# Altium footprint library PcbLibUltimate (1).pcblib: 202 footprints (part 3 of 13)
Each footprint in its own frame and in the unit in brackets; x right, y up, seen from the top. Pads: shape width x height; smd on the part's side, far side on the other; paste and mask are expansions set on the pad; w line width, h text height; cw(c..) or ccw(c..) is an arc to the next point about the centre after c.
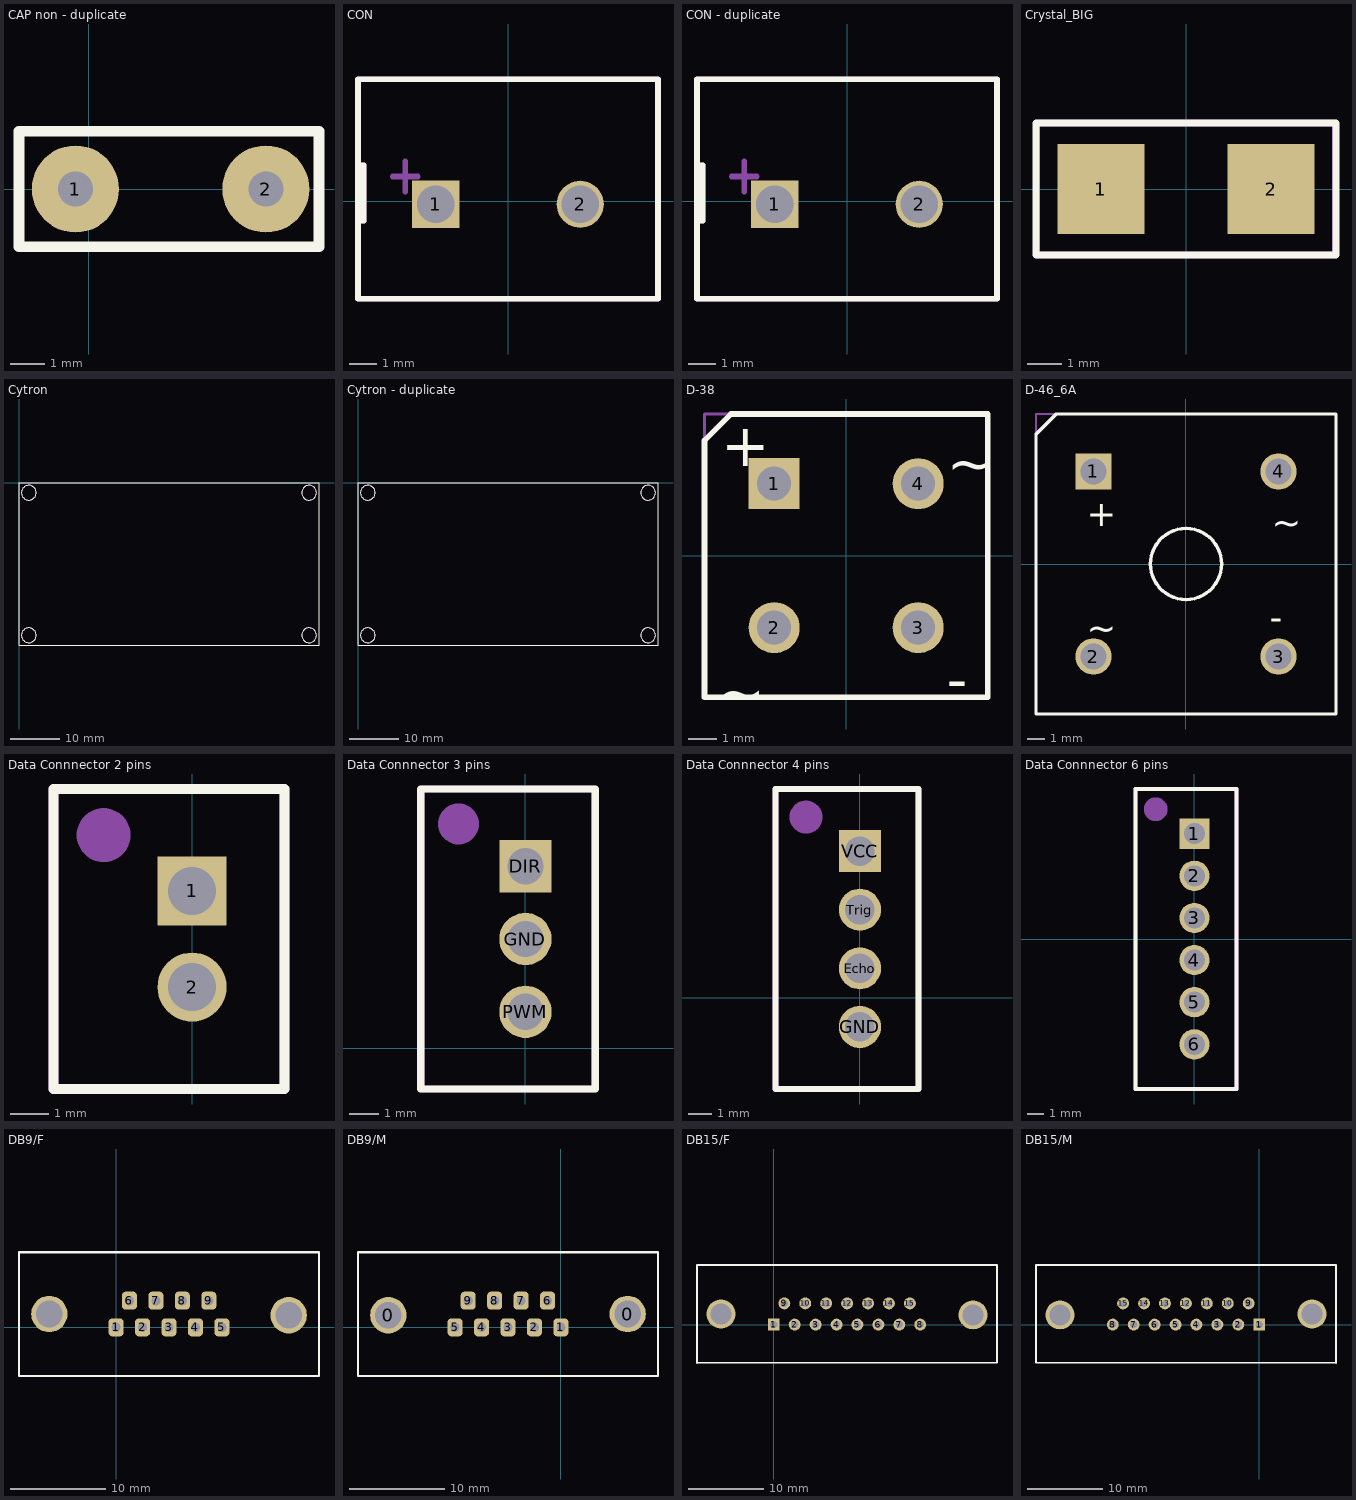
[diagram p2: the footprints below, top view; thin cyan lines are the x and y axes]

## CAP non - duplicate [mm]
pads (2):
  round 2.5 hole 1: 1(-0.381,0) 2(5.08,0)
Top Overlay:
  lines w0.305: -2,-1.651 -2,1.651 6.604,1.651 6.604,-1.651 -2,-1.651
Mechanical 2:
  lines w0.254: -2,-1.651 6.604,-1.651 6.604,1.651 -2,1.651 -2,-1.651
  text ".Designator" at 1.016,-0.508 h1.52
3D body "User Library-Ceramic Capacitors(K104K15X7RF5TH5).step": height 5.2, standoff -5, extent -0.587,-1.3 5.413,1.3

## CON [mm]
pads (2):
  rect 1.7x1.7 hole 1.35: 1(-2.6,-0.1)
  round 1.7 hole 1.35: 2(2.6,-0.1)
Top Overlay:
  lines w0.2: -5.4,-0.7 -5.2,-0.7 -5.2,1.3 -5.4,1.3 ; -5.4,-3.5 -5.4,4.4 5.4,4.4 5.4,-3.5 -5.4,-3.5
Mechanical 2:
  lines w0.2: -5.4,-0.7 -5.2,-0.7 -5.2,1.3 -5.4,1.3 ; -4.15,0.9 -3.7,0.9 -3.25,0.9 ; -3.7,0.35 -3.7,1.45 ; -5.4,-3.5 5.4,-3.5 5.4,4.4 -5.4,4.4 -5.4,-3.5
  text ".Designator" at -1.4,-0.3 h1.52
3D body "User Library-Terminal block 2 POS.STEP": height 10, standoff -3.05, extent -5.08,-3.3 5.08,4.2

## CON - duplicate [mm]
pads (2):
  rect 1.7x1.7 hole 1.35: 1(-2.6,-0.1)
  round 1.7 hole 1.35: 2(2.6,-0.1)
Top Overlay:
  lines w0.2: -5.4,-0.7 -5.2,-0.7 -5.2,1.3 -5.4,1.3 ; -5.4,-3.5 -5.4,4.4 5.4,4.4 5.4,-3.5 -5.4,-3.5
Mechanical 2:
  lines w0.2: -5.4,-0.7 -5.2,-0.7 -5.2,1.3 -5.4,1.3 ; -4.15,0.9 -3.7,0.9 -3.25,0.9 ; -3.7,0.35 -3.7,1.45 ; -5.4,-3.5 5.4,-3.5 5.4,4.4 -5.4,4.4 -5.4,-3.5
  text ".Designator" at -1.4,-0.3 h1.52
3D body "User Library-Terminal block 2 POS.STEP": height 10, standoff -3.05, extent -5.08,-3.3 5.08,4.2

## Crystal_BIG [mm]
pads (2):
  rect 2.5x2.6 smd: 1(-2.45,0) 2(2.45,0)
Top Overlay:
  lines w0.2: -4.318,-1.9 -4.318,0.582 -4.318,1.9 4.318,1.9 4.318,-1.9 -4.318,-1.9
Mechanical 29:
  lines w0.2: -4.3,-1.9 4.3,-1.9 4.3,1.9 -4.3,1.9 -4.3,-1.9
  text "'.Designator'" at 0.8,-3.6 h1.52
3D body "ABM7.STEP": height 1.4, standoff 0, extent -2.997,-1.752 2.997,1.753

## Cytron [mil]
Top Overlay:
  circle w7.87: c78.74,-78.74 r59.06
  circle w7.87: c78.74,-1220.47 r59.06
  circle w7.87: c2322.83,-1220.47 r59.06
  circle w7.87: c2322.83,-78.74 r59.06
  lines w10: 0,-1299.21 0,0 2401.57,0 2401.57,-1299.21 0,-1299.21
Mechanical 1:
  circle w7.87: c78.74,-78.74 r59.06
  circle w7.87: c2322.83,-1220.47 r59.06
  circle w7.87: c2322.83,-78.74 r59.06
  circle w7.87: c78.74,-1220.47 r59.06
3D body "User Library-Terminal block 2 POS.STEP": height 393.7, standoff -120, extent 3.94,-1062.99 299.21,-662.99
3D body "User Library-Terminal block 2 POS.STEP": height 393.7, standoff -120, extent 7.87,-661.42 303.15,-261.42
3D body: height 3.94, standoff 0, extent -3.94,-1295.28 2397.64,3.94

## Cytron - duplicate [mil]
Top Overlay:
  circle w7.87: c2322.83,-78.74 r59.06
  circle w7.87: c2322.83,-1220.47 r59.06
  circle w7.87: c78.74,-1220.47 r59.06
  circle w7.87: c78.74,-78.74 r59.06
  lines w10: 0,-1299.21 2401.57,-1299.21 2401.57,0 0,0 0,-1299.21
Mechanical 1:
  circle w7.87: c78.74,-1220.47 r59.06
  circle w7.87: c2322.83,-78.74 r59.06
  circle w7.87: c2322.83,-1220.47 r59.06
  circle w7.87: c78.74,-78.74 r59.06
3D body: height 531.5, standoff -118.11, extent 2401.57,-314.96 2401.57,-314.96
3D body: height 78.74, standoff 0, extent 2204.72,-511.81 2440.94,-275.59
3D body: height 531.5, standoff -118.11, extent 2401.57,-275.59 2401.57,-275.59
3D body: height 3.94, standoff 0, extent -3.94,-1295.28 2397.64,3.94
3D body "User Library-Terminal block 2 POS.STEP": height 393.7, standoff -120, extent 7.87,-661.42 303.15,-261.42
3D body "User Library-Terminal block 2 POS.STEP": height 393.7, standoff -120, extent 3.94,-1062.99 299.21,-662.99

## D-38 [mm] "Bridge Rectifier; 4 Terminals; Body 9.4 x 9.4 mm (typ); Pitch 5.08 mm"
height 9.91
pads (4):
  rect 1.8x1.8 hole 1.2: 1(-2.54,2.54)
  round 1.8 hole 1.2: 2(-2.54,-2.54) 3(2.54,-2.54) 4(2.54,2.54)
Top Overlay:
  lines w0.2: -5,-5 -5,4.064 -4.064,5 5,5 5,-5 -5,-5
  text "+" at -4.41,3.164 h1.5
  text "-" at 3.556,-5.08 h1.5
  text "~" at -4.572,-5.588 h1.5
  text "~" at 3.556,2.54 h1.5
Mechanical 13:
  lines w0.1: -5,-5 -5,5 5,5 5,-5 -5,-5
3D body: height 9.91, standoff 0, extent -5,-5 5,5

## D-46_6A [mm] "Bridge Rectifier; 4 Terminals; Body 16.8 x 16.8 mm (typ); Pitch 10.67 mm"
height 6.35
pads (4):
  rect 2.1x2.1 hole 1.5: 1(-5.335,5.335)
  round 2.1 hole 1.5: 2(-5.335,-5.335) 3(5.335,-5.335) 4(5.335,5.335)
Top Overlay:
  circle w0.2: c0,0 r2.05
  lines w0.2: -8.65,-8.65 8.65,-8.65 8.65,8.65 -7.474,8.65 -8.65,7.474 -8.65,-8.65
  text "~" at -5.723,-4.437 h1.5
  text "~" at 4.945,1.659 h1.5
  text "-" at 4.825,-3.809 h1.5
  text "+" at -5.723,2.167 h1.5
Mechanical 13:
  lines w0.1: -8.65,-8.65 -8.65,8.65 8.65,8.65 8.65,-8.65 -8.65,-8.65
3D body: height 6.35, standoff 0, extent -8.65,-8.65 8.65,8.65

## Data Connnector 2 pins [mm]
pads (2):
  rect 1.8x1.8 hole 1.25: 1(0,6.25)
  round 1.8 hole 1.25: 2(0,3.75)
Top Overlay:
  lines w0.254: -3.6,1.1 -3.6,8.9 2.4,8.9 2.4,1.1 -3.6,1.1
Mechanical 2:
  circle w1: c-2.3,7.7 r0.2
  lines w0.254: -3.6,1.1 2.4,1.1 2.4,8.9 -3.6,8.9 -3.6,1.1
  text ".Designator" at -1.3,8.4 h2
3D body "User Library-JST B2B-XH-A.step": height 7.01, standoff -3.39, extent -3.475,1.3 2.275,8.7

## Data Connnector 3 pins [mm]
pads (3):
  rect 1.8x1.8 hole 1.25: DIR(0,6.25)
  round 1.8 hole 1.25: GND(0,3.75) PWM(0,1.25)
Top Overlay:
  lines w0.254: -3.6,-1.4 2.4,-1.4 2.4,8.9 -3.6,8.9 -3.6,-1.4
Mechanical 2:
  circle w1: c-2.3,7.7 r0.2
  lines w0.254: -3.6,-1.4 -3.6,8.9 2.4,8.9 2.4,-1.4 -3.6,-1.4
  text ".Designator" at -1.4,5.2 h2
3D body "User Library-jst-b3b-xh-a.step": height 6.91, standoff -3.49, extent -3.475,-1.2 2.275,8.7

## Data Connnector 4 pins [mm]
pads (4):
  round 1.8 hole 1.25: Echo(0,1.25) GND(0,-1.25) Trig(0,3.75)
  rect 1.8x1.8 hole 1.25: VCC(0,6.25)
Top Overlay:
  lines w0.254: -3.6,-3.9 -3.6,8.9 2.5,8.9 2.5,-3.9 -3.6,-3.9
Mechanical 2:
  circle w1: c-2.3,7.7 r0.2
  lines w0.254: -3.6,-3.9 2.5,-3.9 2.5,8.9 -3.6,8.9 -3.6,-3.9
  text ".Designator" at -1.4,5.2 h2
3D body "User Library-jst-b4b-xh-a-1.step": height 6.91, standoff -3.49, extent -3.45,-3.7 2.3,8.7

## Data Connnector 6 pins [mm]
pads (6):
  rect 1.8x1.8 hole 1.25: 1(0,6.25)
  round 1.8 hole 1.25: 2(0,3.75) 3(0,1.25) 4(0,-1.25) 5(0,-3.75) 6(0,-6.25)
Top Overlay:
  lines w0.254: -3.5,-8.9 2.5,-8.9 2.5,8.9 -3.5,8.9 -3.5,-8.9
Mechanical 2:
  circle w1: c-2.3,7.7 r0.2
  lines w0.254: -3.5,-8.9 2.5,-8.9 2.5,8.9 -3.5,8.9 -3.5,-8.9
  text ".Designator" at -1,3.2 h2
3D body "User Library-jst-b6b-xh-a.step": height 6.91, standoff -3.49, extent -3.375,-8.7 2.375,8.7

## DB9/F [mil]
pads (11):
  rrect50% 62x73.62 hole 38: 1(0,0) 2(109,0) 3(218,0) 4(327,0) 5(436,0) 6(55,110) 7(164,110) 8(273,110) 9(382,110)
  round 150 hole 110: ""(-275,55) ""(711,50)
Top Overlay:
  lines w8: -400,-200 836,-200 836,310
  lines w10: -400,-200 -400,310 836,310

## DB9/M [mil]
pads (11):
  round 150 hole 110: 0(-711,50) 0(275,55)
  rrect50% 62x73.62 hole 38: 1(0,0) 2(-109,0) 3(-218,0) 4(-327,0) 5(-436,0) 6(-55,110) 7(-164,110) 8(-273,110) 9(-382,110)
Top Overlay:
  lines w8: -836,310 -836,-200 400,-200
  lines w10: -836,310 400,310 400,-200

## DB15/F [mil]
pads (17):
  rect 62x62 hole 38: 1(0,0)
  round 62 hole 38: 2(109,0) 3(218,0) 4(327,0) 5(436,0) 6(545,0) 7(654,0) 8(763,0) 9(55,110) 10(164,110) 11(273,110) 12(382,110) 13(491,110) 14(600,110) 15(709,110)
  round 150 hole 110: ""(-275,55) ""(1038,50)
Top Overlay:
  lines w8: -400,-200 1163,-200 1163,310
  lines w10: -400,-200 -400,310 1163,310

## DB15/M [mil]
pads (17):
  rect 62x62 hole 38: 1(0,0)
  round 62 hole 38: 2(-109,0) 3(-218,0) 4(-327,0) 5(-436,0) 6(-545,0) 7(-654,0) 8(-763,0) 9(-55,110) 10(-164,110) 11(-273,110) 12(-382,110) 13(-491,110) 14(-600,110) 15(-709,110)
  round 150 hole 110: ""(-1038,50) ""(275,55)
Top Overlay:
  lines w8: -1163,310 -1163,-200 400,-200
  lines w10: -1163,310 400,310 400,-200